# Altium footprint library 7-Connectors-12.PcbLib: 76 footprints (part 5 of 5)
Each footprint in its own frame and in the unit in brackets; x right, y up, seen from the top. Pads: shape width x height; smd on the part's side, far side on the other; paste and mask are expansions set on the pad; w line width, h text height; cw(c..) or ccw(c..) is an arc to the next point about the centre after c.
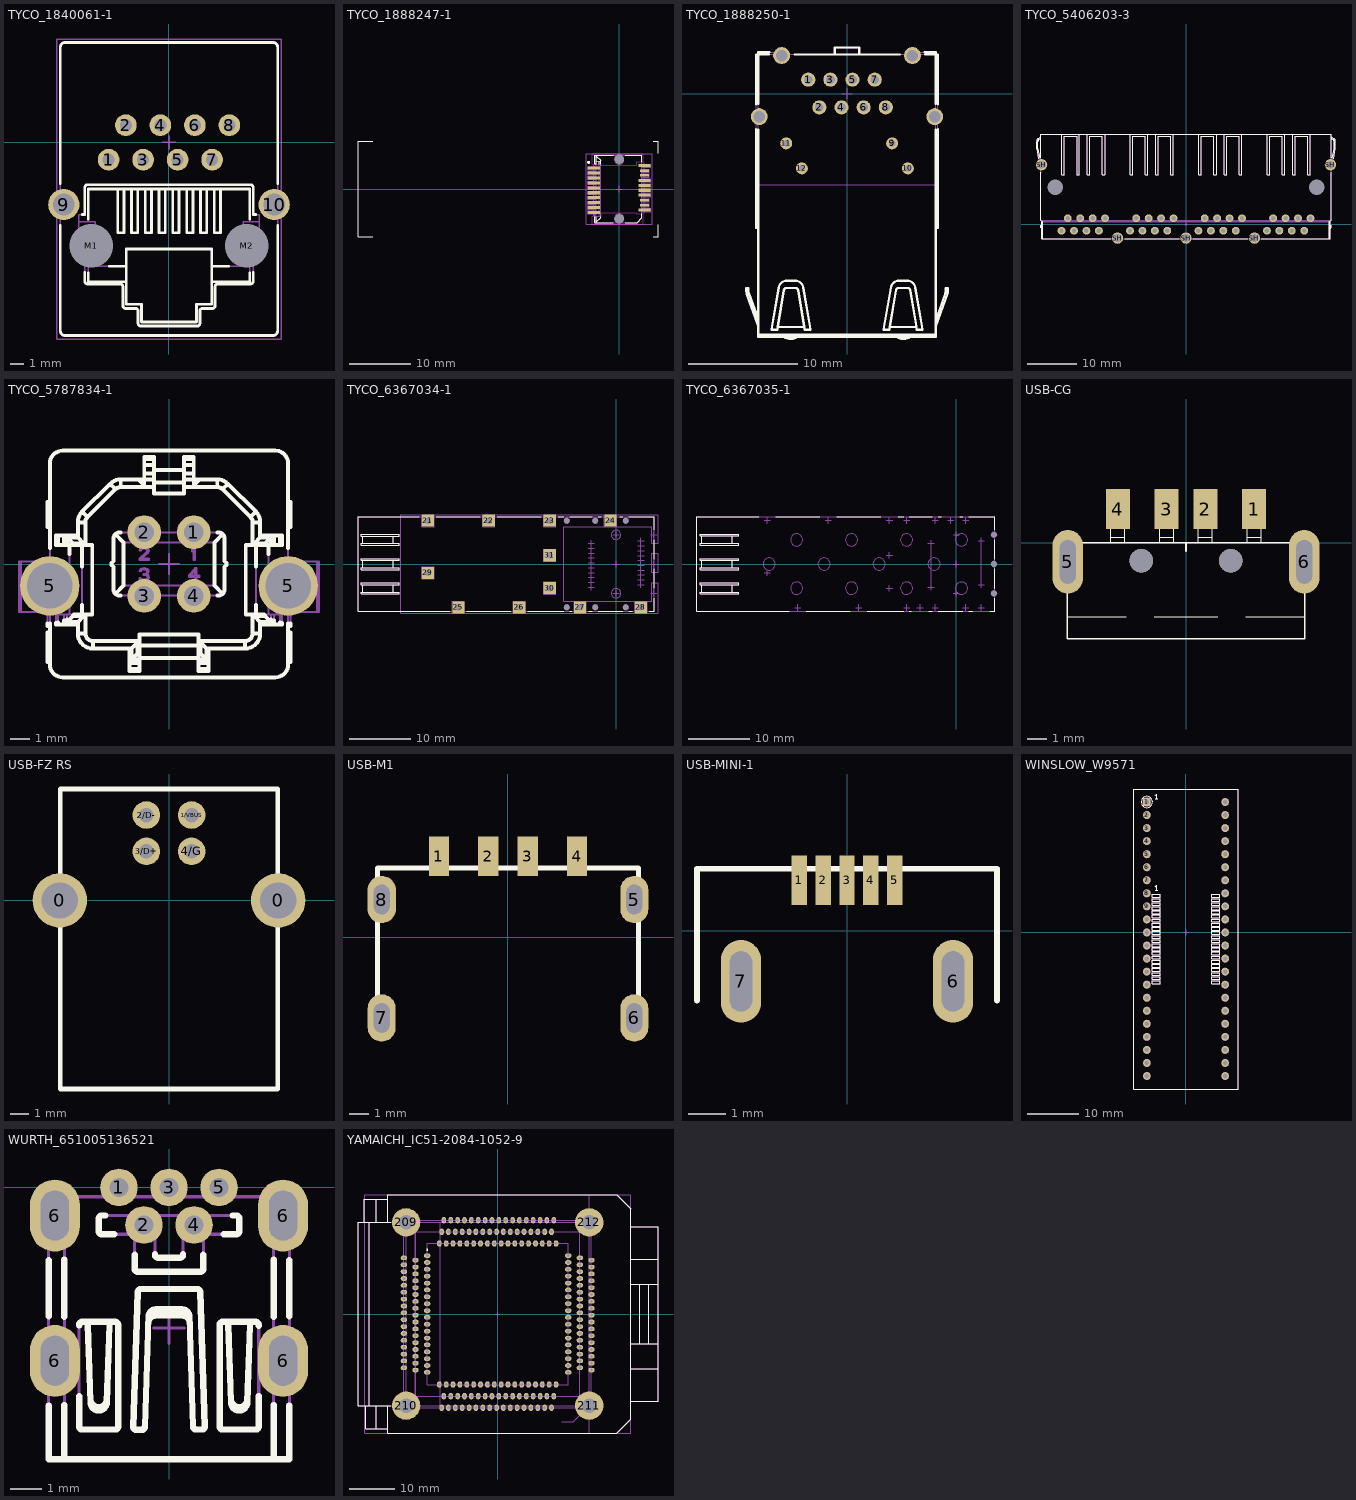
[diagram p4: the footprints below, top view; thin cyan lines are the x and y axes]

## TYCO_1840061-1 [mm] "1 Port, Without LED, RJ45 10/100Base-T Ethernet Vertical Connector Module With Integrated Magnetics"
height 16.51
pads (12):
  round 1.6 hole 0.9: 1(-4.445,-1.27) 2(-3.175,1.27) 3(-1.905,-1.27) 4(-0.635,1.27) 5(0.635,-1.27) 6(1.905,1.27) 7(3.175,-1.27) 8(4.445,1.27)
  round 2.3 hole 1.6: 9(-7.747,-4.572) 10(7.747,-4.572)
  round 1 hole 3.2 unplated mask+1.1: M1(-5.715,-7.62) M2(5.715,-7.62)
Top Overlay:
  lines w0.2: -8,-6.101 -8,-13.87 ccw(c-7.65,-13.87) -7.65,-14.22 7.65,-14.22 ccw(c7.65,-13.87) 8,-13.87 8,-6.101 ; -8,-3.043 -8,7.02 cw(c-7.65,7.02) -7.65,7.37 7.65,7.37 cw(c7.65,7.02) 8,7.02 8,-3.043 ; -6.382,-5.31 -6.2,-5.31 -6.2,-3.31 cw(c-6,-3.31) -6,-3.11 6,-3.11 cw(c6,-3.31) 6.2,-3.31 6.2,-5.31 6.382,-5.31 ; -6.2,-9.562 -6.2,-10.22 ccw(c-6,-10.22) -6,-10.42 -3.595,-10.42 cw(c-3.595,-10.62) -3.395,-10.62 -3.395,-12.02 ccw(c-3.195,-12.02) -3.195,-12.22 -2.475,-12.22 cw(c-2.475,-12.42) -2.275,-12.42 -2.275,-13.32 ccw(c-2.075,-13.32) -2.075,-13.52 2.075,-13.52 ccw(c2.075,-13.32) 2.275,-13.32 2.275,-12.42 cw(c2.475,-12.42) 2.475,-12.22 3.195,-12.22 ccw(c3.195,-12.02) 3.395,-12.02 3.395,-10.62 cw(c3.595,-10.62) 3.595,-10.42 6,-10.42 ccw(c6,-10.22) 6.2,-10.22 6.2,-9.562 ; -5.955,-9.607 -5.955,-10.25 -3.15,-10.25 ; -5.955,-5.636 -5.955,-3.42 5.955,-3.42 5.955,-5.636 ; -4.379,-9.11 -3.15,-9.11 ; -3.78,-3.42 -3.78,-6.654 -3.32,-6.654 -3.32,-3.42 ; -2.764,-3.42 -2.764,-6.654 -2.304,-6.654 -2.304,-3.42 ; -1.748,-3.42 -1.748,-6.654 -1.288,-6.654 -1.288,-3.42 ; -0.732,-3.42 -0.732,-6.654 -0.272,-6.654 -0.272,-3.42 ; 0.284,-3.42 0.284,-6.654 0.744,-6.654 0.744,-3.42 ; 1.3,-3.42 1.3,-6.654 1.76,-6.654 1.76,-3.42 ; 2.316,-3.42 2.316,-6.654 2.776,-6.654 2.776,-3.42 ; 3.15,-10.25 5.955,-10.25 5.955,-9.607 ; 3.15,-9.11 4.379,-9.11 ; 3.332,-3.42 3.332,-6.654 3.792,-6.654 3.792,-3.42 ; -3.15,-11.92 -2.03,-11.92 -2.03,-13.22 2.03,-13.22 2.03,-11.92 3.15,-11.92 3.15,-7.84 -3.15,-7.84 -3.15,-11.92
Mechanical 8:
  lines w0.1: -8.245,-4.572 -7.745,-4.572 ; -7.745,-5.072 -7.745,-4.572 ; -7.745,-4.072 -7.745,-4.572 ; -7.245,-4.572 -7.745,-4.572 ; -6.215,-7.622 -5.715,-7.622 ; -5.715,-8.122 -5.715,-7.622 ; -5.715,-7.122 -5.715,-7.622 ; -5.215,-7.622 -5.715,-7.622 ; -4.945,-1.272 -4.445,-1.272 ; -4.445,-1.772 -4.445,-1.272 ; -4.445,-0.772 -4.445,-1.272 ; -3.945,-1.272 -4.445,-1.272 ; -3.675,1.268 -3.175,1.268 ; -3.175,0.768 -3.175,1.268 ; -3.175,1.768 -3.175,1.268 ; -2.675,1.268 -3.175,1.268 ; -2.405,-1.272 -1.905,-1.272 ; -1.905,-1.772 -1.905,-1.272 ; -1.905,-0.772 -1.905,-1.272 ; -1.405,-1.272 -1.905,-1.272 ; -1.135,1.268 -0.635,1.268 ; -0.635,0.768 -0.635,1.268 ; -0.635,1.768 -0.635,1.268 ; -0.5,0 0,0 ; -0.135,1.268 -0.635,1.268 ; 0,-0.5 0,0 ; 0,0.5 0,0 ; 0.135,-1.272 0.635,-1.272 ; 0.5,0 0,0 ; 0.635,-1.772 0.635,-1.272 ; 0.635,-0.772 0.635,-1.272 ; 1.135,-1.272 0.635,-1.272 ; 1.405,1.268 1.905,1.268 ; 1.905,0.768 1.905,1.268 ; 1.905,1.768 1.905,1.268 ; 2.405,1.268 1.905,1.268 ; 2.675,-1.272 3.175,-1.272 ; 3.175,-1.772 3.175,-1.272 ; 3.175,-0.772 3.175,-1.272 ; 3.675,-1.272 3.175,-1.272 ; 3.945,1.268 4.445,1.268 ; 4.445,0.768 4.445,1.268 ; 4.445,1.768 4.445,1.268 ; 4.945,1.268 4.445,1.268 ; 5.215,-7.622 5.715,-7.622 ; 5.715,-8.122 5.715,-7.622 ; 5.715,-7.122 5.715,-7.622 ; 6.215,-7.622 5.715,-7.622 ; 7.245,-4.572 7.745,-4.572 ; 7.745,-5.072 7.745,-4.572 ; 7.745,-4.072 7.745,-4.572 ; 8.245,-4.572 7.745,-4.572
Mechanical 14:
  lines w0.1: -6.635,-7.85 -5.449,-7.85 -5.449,-5.82 -6.635,-5.82 ; -5.955,-9.11 -3.15,-9.11 ; -5.955,-7.85 -5.955,-10.25 -3.15,-10.25 ; -5.955,-5.82 -5.955,-3.42 5.955,-3.42 5.955,-5.82 ; -3.78,-3.42 -3.78,-6.654 -3.32,-6.654 -3.32,-3.42 ; -2.764,-3.42 -2.764,-6.654 -2.304,-6.654 -2.304,-3.42 ; -1.748,-3.42 -1.748,-6.654 -1.288,-6.654 -1.288,-3.42 ; -0.732,-3.42 -0.732,-6.654 -0.272,-6.654 -0.272,-3.42 ; 0.284,-3.42 0.284,-6.654 0.744,-6.654 0.744,-3.42 ; 1.3,-3.42 1.3,-6.654 1.76,-6.654 1.76,-3.42 ; 2.316,-3.42 2.316,-6.654 2.776,-6.654 2.776,-3.42 ; 3.15,-10.25 5.955,-10.25 5.955,-7.85 ; 3.15,-9.11 5.954,-9.11 ; 3.332,-3.42 3.332,-6.654 3.792,-6.654 3.792,-3.42 ; 6.635,-7.85 5.48,-7.85 5.48,-5.82 6.635,-5.82 ; -8,-13.87 ccw(c-7.65,-13.87) -7.65,-14.22 7.65,-14.22 ccw(c7.65,-13.87) 8,-13.87 8,7.02 ccw(c7.65,7.02) 7.65,7.37 -7.65,7.37 ccw(c-7.65,7.02) -8,7.02 -8,-13.87 ; -6.635,-8.36 -6.635,-5.31 -6.2,-5.31 -6.2,-3.31 cw(c-6,-3.31) -6,-3.11 6,-3.11 cw(c6,-3.31) 6.2,-3.31 6.2,-5.31 6.635,-5.31 6.635,-8.36 6.2,-8.36 6.2,-10.22 cw(c6,-10.22) 6,-10.42 3.595,-10.42 ccw(c3.595,-10.62) 3.395,-10.62 3.395,-12.02 cw(c3.195,-12.02) 3.195,-12.22 2.475,-12.22 ccw(c2.475,-12.42) 2.275,-12.42 2.275,-13.32 cw(c2.075,-13.32) 2.075,-13.52 -2.075,-13.52 cw(c-2.075,-13.32) -2.275,-13.32 -2.275,-12.42 ccw(c-2.475,-12.42) -2.475,-12.22 -3.195,-12.22 cw(c-3.195,-12.02) -3.395,-12.02 -3.395,-10.62 ccw(c-3.595,-10.62) -3.595,-10.42 -6,-10.42 cw(c-6,-10.22) -6.2,-10.22 -6.2,-8.36 -6.635,-8.36 ; -3.15,-11.92 -2.03,-11.92 -2.03,-13.22 2.03,-13.22 2.03,-11.92 3.15,-11.92 3.15,-7.84 -3.15,-7.84 -3.15,-11.92
Mechanical 15:
  lines w0.1: -8.25,-14.47 8.25,-14.47 8.25,7.62 -8.25,7.62 -8.25,-14.47
3D body "TYCO_1840061-1.stp": height 16.51, standoff -4, extent -8,-14.22 8,7.37

## TYCO_1888247-1 [mm] "20 Position, Pitch 0.8mm SFP Receptacle (Small Form-factor Pluggable)"
height 5.4
pads (22):
  rect 2x0.5 smd: 1(-4.1,3.395) 2(-4.1,2.595) 3(-4.1,1.795) 4(-4.1,0.995) 5(-4.1,0.195) 6(-4.1,-0.605) 7(-4.1,-1.405) 8(-4.1,-2.205) 9(-4.1,-3.005) 10(-4.1,-3.805) 11(4.1,-3.405) 14(4.1,-1.005) 15(4.1,-0.205) 16(4.1,0.595) 17(4.1,1.395) 20(4.1,3.795)
  rect 1.5x0.4 smd: 12(4.1,-2.605) 13(4.1,-1.805) 18(4.1,2.195) 19(4.1,2.995)
  round 1 hole 1.55 unplated mask+0.28: MTG1(0,4.795) MTG2(0,-4.805)
Top Layer keep-out:
  lines w0.1: -4.34,-5.755 -4.34,-4.395 -2.88,-4.395 -2.88,-3.855 2.88,-3.855 2.88,-3.995 3.94,-3.995 3.94,-4.805 3.94,-5.755 -4.34,-5.755 ; -4.34,3.985 -4.34,5.745 3.94,5.745 3.94,4.385 2.88,4.385 2.88,3.845 -2.88,3.845 -2.88,3.985 -4.34,3.985
Top Overlay:
  circle w0.25: c-4.955,4.318 r0.125
  lines w0.2: -40,-7.774 -42.4,-7.774 -42.4,7.774 -40,7.774 ; -4,-4.505 -4,-5.505 -0.944,-5.505 ; -3.7,-5.505 -3.7,-4.505 ; -3.7,-5.305 -2.98,-4.705 -2.98,-4.505 ; -3.7,4.045 -3.7,5.495 ; -3.7,4.095 -4,4.095 -4,5.495 -0.944,5.495 ; -3.7,4.432 -2.98,4.495 ; -3.7,5.295 -2.98,4.695 -2.98,4.045 ; -3.223,4.045 -3.223,4.474 ; 0.944,-5.505 2.9,-5.505 3.7,-4.705 3.7,-4.055 ; 0.944,5.495 3.7,5.495 3.7,4.445 ; 5.5,-7.774 6.3,-7.774 6.3,-5.777 ; 5.5,7.774 6.3,7.774 6.3,5.777
Mechanical 8:
  circle w0.1: c0,-4.805 r0.775
  circle w0.1: c0,4.795 r0.775
  lines w0.1: -4.6,-3.805 -4.1,-3.805 -3.6,-3.805 ; -4.6,-3.005 -4.1,-3.005 -3.6,-3.005 ; -4.6,-2.205 -4.1,-2.205 -3.6,-2.205 ; -4.6,-1.405 -4.1,-1.405 -3.6,-1.405 ; -4.6,-0.605 -4.1,-0.605 -3.6,-0.605 ; -4.6,0.195 -4.1,0.195 -3.6,0.195 ; -4.6,0.995 -4.1,0.995 -3.6,0.995 ; -4.6,1.795 -4.1,1.795 -3.6,1.795 ; -4.6,2.595 -4.1,2.595 -3.6,2.595 ; -4.6,3.395 -4.1,3.395 -3.6,3.395 ; -4.1,-4.305 -4.1,3.895 ; -0.5,-4.805 0,-4.805 ; -0.5,0 0,0 ; -0.5,4.795 0,4.795 ; 0,-5.305 0,-4.805 ; 0,-4.305 0,-4.805 ; 0,-0.5 0,0 ; 0,0.5 0,0 ; 0,4.295 0,4.795 ; 0,5.295 0,4.795 ; 0.5,-4.805 0,-4.805 ; 0.5,0 0,0 ; 0.5,4.795 0,4.795 ; 3.6,-3.405 4.1,-3.405 4.6,-3.405 ; 3.6,-2.605 4.1,-2.605 4.6,-2.605 ; 3.6,-1.805 4.1,-1.805 4.6,-1.805 ; 3.6,-1.005 4.1,-1.005 4.6,-1.005 ; 3.6,-0.205 4.1,-0.205 4.6,-0.205 ; 3.6,0.595 4.1,0.595 4.6,0.595 ; 3.6,1.395 4.1,1.395 4.6,1.395 ; 3.6,2.195 4.1,2.195 4.6,2.195 ; 3.6,2.995 4.1,2.995 4.6,2.995 ; 3.6,3.795 4.1,3.795 4.6,3.795 ; 4.1,-3.905 4.1,4.295
Mechanical 14:
  circle w0.1: c-4.955,4.318 r0.125
  lines w0.1: -3.7,-5.505 -3.7,-4.105 ; -3.7,-5.305 -2.98,-4.705 -2.98,-4.505 ; -3.7,-4.442 -2.98,-4.505 ; -3.7,-4.055 -5.1,-4.055 -5.1,-3.555 -3.7,-3.555 ; -3.7,-3.255 -5.1,-3.255 -5.1,-2.755 -3.7,-2.755 ; -3.7,-2.455 -5.1,-2.455 -5.1,-1.955 -3.7,-1.955 ; -3.7,-1.655 -5.1,-1.655 -5.1,-1.155 -3.7,-1.155 ; -3.7,-0.855 -5.1,-0.855 -5.1,-0.355 -3.7,-0.355 ; -3.7,-0.055 -5.1,-0.055 -5.1,0.445 -3.7,0.445 ; -3.7,0.745 -5.1,0.745 -5.1,1.245 -3.7,1.245 ; -3.7,1.545 -5.1,1.545 -5.1,2.045 -3.7,2.045 ; -3.7,2.345 -5.1,2.345 -5.1,2.845 -3.7,2.845 ; -3.7,3.145 -5.1,3.145 -5.1,3.645 -3.7,3.645 ; -3.7,4.432 -2.98,4.495 ; -3.7,5.295 -2.985,4.695 -2.98,4.695 -2.98,4.495 ; -3.7,5.495 -3.7,4.095 ; -3.223,-4.484 -3.223,4.474 ; 3.7,-3.655 5.1,-3.655 5.1,-3.155 3.7,-3.155 ; 3.7,-2.855 4.85,-2.855 4.85,-2.355 3.7,-2.355 ; 3.7,-2.055 4.85,-2.055 4.85,-1.555 3.7,-1.555 ; 3.7,-1.255 5.1,-1.255 5.1,-0.755 3.7,-0.755 ; 3.7,-0.455 5.1,-0.455 5.1,0.045 3.7,0.045 ; 3.7,0.345 5.1,0.345 5.1,0.845 3.7,0.845 ; 3.7,1.145 5.1,1.145 5.1,1.645 3.7,1.645 ; 3.7,1.945 4.85,1.945 4.85,2.445 3.7,2.445 ; 3.7,2.745 4.85,2.745 4.85,3.245 3.7,3.245 ; 3.7,3.545 5.1,3.545 5.1,4.045 3.7,4.045 ; -3.7,-4.105 -4,-4.105 -4,-5.505 2.9,-5.505 3.7,-4.705 3.7,5.495 -4,5.495 -4,4.095 -3.7,4.095 ; -3.7,-4.105 -3.7,4.095 ; -2.98,-4.505 -2.98,4.495
Mechanical 15:
  lines w0.1: -5.325,-5.755 -5.325,5.745 5.375,5.745 5.375,-5.755 -5.325,-5.755
3D body "TYCO_1888247-1.stp": height 5.22, standoff -0.8, extent -4.5,-5.505 4.5,5.495

## TYCO_1888250-1 [mm] "1 Port, Yellow/Green LEDs, RJ45 10/100Base-T, Cat 5, Ethernet Connector Module"
height 7.38
pads (16):
  round 1.3 hole 0.8: 1(-3.556,1.27) 2(-2.54,-1.27) 3(-1.524,1.27) 4(-0.508,-1.27) 5(0.508,1.27) 6(1.524,-1.27) 7(2.54,1.27) 8(3.556,-1.27)
  round 1.1 hole 0.6: 9(4.14,-4.57) 10(5.58,-6.87) 11(-5.58,-4.57) 12(-4.14,-6.87)
  round 1.55 hole 1.05: SHIELD(-8.045,-2.12) SHIELD(-6,3.48) SHIELD(6,3.48) SHIELD(8.045,-2.12)
Top Overlay:
  lines w0.2: -8.345,-3.256 -8.345,-12.32 -8.145,-12.32 ; -8.345,-0.984 -8.345,3.58 -7.171,3.58 ; -8.145,-22.12 8.145,-22.12 ; -8.145,-20.703 -9.015,-18.311 cw(c-8.545,-18.14) -9.045,-18.14 -9.045,-17.84 -9.245,-17.84 -9.245,-18.14 ccw(c-8.545,-18.14) -9.203,-18.379 -8.19,-21.164 ; -8.145,-3.291 -8.145,-22.32 8.145,-22.32 8.145,-3.291 ; -8.145,-0.949 -8.145,3.78 -7.136,3.78 ; -5.841,-22.326 ccw(c-5.029,-20.72) -5.16,-22.515 ccw(c-5.291,-20.72) -4.47,-22.322 ; -4.829,3.58 4.829,3.58 ; -4.482,-18.052 ccw(c-4.729,-18.09) -4.729,-17.84 -5.551,-17.84 ccw(c-5.551,-18.09) -5.798,-18.052 -6.359,-21.42 ; -4.475,-18.051 -3.921,-21.42 ; -1.119,3.58 -1.119,4.22 1.125,4.22 1.125,3.58 ; 4.471,-22.322 ccw(c5.291,-20.72) 5.16,-22.515 ccw(c5.029,-20.72) 5.843,-22.325 ; 5.798,-18.052 ccw(c5.551,-18.09) 5.551,-17.84 4.729,-17.84 ccw(c4.729,-18.09) 4.482,-18.052 3.921,-21.42 ; 5.805,-18.051 6.359,-21.42 ; 7.136,3.78 8.145,3.78 8.145,-0.949 ; 7.171,3.58 8.345,3.58 8.345,-0.984 ; 8.145,-21.42 8.165,-21.303 9.205,-18.374 ccw(c8.545,-18.14) 9.245,-18.14 ; 8.145,-20.762 9.016,-18.307 ccw(c8.545,-18.14) 9.045,-18.14 9.045,-17.84 9.245,-17.84 9.245,-18.143 ; 8.145,-12.32 8.345,-12.32 8.345,-3.256 ; -8.19,-21.164 -8.145,-21.42 -8.19,-21.164 ; -6.359,-21.42 -6.39,-21.67 -6.938,-21.67 -6.257,-17.79 cw(c-5.519,-17.92) -5.519,-17.17 -4.761,-17.17 cw(c-4.761,-17.92) -4.023,-17.79 -3.342,-21.67 -3.89,-21.67 -3.921,-21.42 ; -6.359,-21.42 -3.921,-21.42 ; 3.921,-21.42 3.89,-21.67 3.342,-21.67 4.023,-17.79 cw(c4.761,-17.92) 4.761,-17.17 5.519,-17.17 cw(c5.519,-17.92) 6.257,-17.79 6.938,-21.67 6.39,-21.67 6.359,-21.42 ; 3.921,-21.42 6.359,-21.42
Mechanical 8:
  lines w0.1: -8.545,-2.12 -8.045,-2.12 ; -8.15,-8.37 8.15,-8.37 ; -8.045,-2.62 -8.045,-2.12 ; -8.045,-1.62 -8.045,-2.12 ; -7.545,-2.12 -8.045,-2.12 ; -6.5,3.48 -6,3.48 ; -6.08,-4.57 -5.58,-4.57 ; -6,2.98 -6,3.48 ; -6,3.98 -6,3.48 ; -5.58,-5.07 -5.58,-4.57 ; -5.58,-4.07 -5.58,-4.57 ; -5.5,3.48 -6,3.48 ; -5.08,-4.57 -5.58,-4.57 ; -4.64,-6.87 -4.14,-6.87 ; -4.14,-7.37 -4.14,-6.87 ; -4.14,-6.37 -4.14,-6.87 ; -4.056,1.27 -3.556,1.27 ; -3.64,-6.87 -4.14,-6.87 ; -3.556,0.77 -3.556,1.27 ; -3.556,1.77 -3.556,1.27 ; -3.056,1.27 -3.556,1.27 ; -3.04,-1.27 -2.54,-1.27 ; -2.54,-1.77 -2.54,-1.27 ; -2.54,-0.77 -2.54,-1.27 ; -2.04,-1.27 -2.54,-1.27 ; -2.024,1.27 -1.524,1.27 ; -1.524,0.77 -1.524,1.27 ; -1.524,1.77 -1.524,1.27 ; -1.024,1.27 -1.524,1.27 ; -1.008,-1.27 -0.508,-1.27 ; -0.508,-1.77 -0.508,-1.27 ; -0.508,-0.77 -0.508,-1.27 ; -0.5,0 0,0 ; -0.008,-1.27 -0.508,-1.27 ; 0,-0.5 0,0 ; 0,0.5 0,0 ; 0.008,1.27 0.508,1.27 ; 0.5,0 0,0 ; 0.508,0.77 0.508,1.27 ; 0.508,1.77 0.508,1.27 ; 1.008,1.27 0.508,1.27 ; 1.024,-1.27 1.524,-1.27 ; 1.524,-1.77 1.524,-1.27 ; 1.524,-0.77 1.524,-1.27 ; 2.024,-1.27 1.524,-1.27 ; 2.04,1.27 2.54,1.27 ; 2.54,0.77 2.54,1.27 ; 2.54,1.77 2.54,1.27 ; 3.04,1.27 2.54,1.27 ; 3.056,-1.27 3.556,-1.27 ; 3.556,-1.77 3.556,-1.27 ; 3.556,-0.77 3.556,-1.27 ; 3.64,-4.57 4.14,-4.57 ; 4.056,-1.27 3.556,-1.27 ; 4.14,-5.07 4.14,-4.57 ; 4.14,-4.07 4.14,-4.57 ; 4.64,-4.57 4.14,-4.57 ; 5.08,-6.87 5.58,-6.87 ; 5.5,3.48 6,3.48 ; 5.58,-7.37 5.58,-6.87 ; 5.58,-6.37 5.58,-6.87 ; 6,2.98 6,3.48 ; 6,3.98 6,3.48 ; 6.08,-6.87 5.58,-6.87 ; 6.5,3.48 6,3.48 ; 7.545,-2.12 8.045,-2.12 ; 8.045,-2.62 8.045,-2.12 ; 8.045,-1.62 8.045,-2.12 ; 8.545,-2.12 8.045,-2.12
Mechanical 14:
  lines w0.1: -8.145,-22.12 8.145,-22.12 ; -8.145,-20.703 -9.015,-18.311 cw(c-8.545,-18.14) -9.045,-18.14 -9.045,-17.84 -9.245,-17.84 -9.245,-18.14 ccw(c-8.545,-18.14) -9.203,-18.379 -8.19,-21.164 ; -8.145,-12.32 -8.345,-12.32 -8.345,3.58 8.345,3.58 8.345,-12.32 8.145,-12.32 ; -6.395,3.58 -6.395,3.78 -8.145,3.78 -8.145,-22.32 8.145,-22.32 8.145,3.78 6.395,3.78 6.395,3.58 ; -5.841,-22.326 ccw(c-5.029,-20.72) -5.16,-22.515 ccw(c-5.291,-20.72) -4.47,-22.322 ; -4.482,-18.052 ccw(c-4.729,-18.09) -4.729,-17.84 -5.551,-17.84 ccw(c-5.551,-18.09) -5.798,-18.052 -6.359,-21.42 ; -4.475,-18.051 -3.921,-21.42 ; -1.119,3.58 -1.119,4.22 1.125,4.22 1.125,3.58 ; 4.473,-22.323 ccw(c5.291,-20.72) 5.16,-22.515 ccw(c5.029,-20.72) 5.851,-22.321 ; 5.798,-18.052 ccw(c5.551,-18.09) 5.551,-17.84 4.729,-17.84 ccw(c4.729,-18.09) 4.482,-18.052 3.921,-21.42 ; 5.805,-18.051 6.359,-21.42 ; 8.145,-21.42 8.165,-21.303 9.205,-18.374 ccw(c8.545,-18.14) 9.245,-18.14 ; 8.145,-20.762 9.016,-18.307 ccw(c8.545,-18.14) 9.045,-18.14 9.045,-17.84 9.245,-17.84 9.245,-18.143 ; -8.19,-21.164 -8.145,-21.42 -8.19,-21.164 ; -6.359,-21.42 -6.39,-21.67 -6.938,-21.67 -6.257,-17.79 cw(c-5.519,-17.92) -5.519,-17.17 -4.761,-17.17 cw(c-4.761,-17.92) -4.023,-17.79 -3.342,-21.67 -3.89,-21.67 -3.921,-21.42 ; -6.359,-21.42 -3.921,-21.42 ; 3.921,-21.42 3.89,-21.67 3.342,-21.67 4.023,-17.79 cw(c4.761,-17.92) 4.761,-17.17 5.519,-17.17 cw(c5.519,-17.92) 6.257,-17.79 6.938,-21.67 6.39,-21.67 6.359,-21.42 ; 3.921,-21.42 6.359,-21.42
Drill Drawing:
  lines w0.1: -9.25,-8.355 -9.25,5 9.245,5 9.245,-8.355 -7.08,-8.355 -9.25,-8.355
  text "+0.05/-0.05" at -4.5,-13 h1
  text "Daimeter Tolerance" at -6.5,-11.5 h1
  text "PRESS-FIT TECHNOLOGY" at -8.5,-10 h1
3D body "TYCO_1888250-1.stp": height 8.48, standoff -5.3, extent -9.245,-22.515 9.245,4.22

## TYCO_5406203-3 [mm] "4 x RJ45 Jacks - 8 Positions"
height 13.64
pads (39):
  round 1.6 hole 0.9: 1A(-16.51,1.27) 1B(-2.54,1.27) 1C(11.43,1.27) 1D(25.4,1.27) 2A(-17.78,-1.27) 2B(-3.81,-1.27) 2C(10.16,-1.27) 2D(24.13,-1.27) 3A(-19.05,1.27) 3B(-5.08,1.27) 3C(8.89,1.27) 3D(22.86,1.27) 4A(-20.32,-1.27) 4B(-6.35,-1.27) 4C(7.62,-1.27) 4D(21.59,-1.27) 5A(-21.59,1.27) 5B(-7.62,1.27) 5C(6.35,1.27) 5D(20.32,1.27) 6A(-22.86,-1.27) 6B(-8.89,-1.27) 6C(5.08,-1.27) 6D(19.05,-1.27) 7A(-24.13,1.27) 7B(-10.16,1.27) 7C(3.81,1.27) 7D(17.78,1.27) 8A(-25.4,-1.27) 8B(-11.43,-1.27) 8C(2.54,-1.27) 8D(16.51,-1.27)
  round 1 hole 3.2 unplated mask+1.35: M1(26.67,7.62) M2(-26.67,7.62)
  round 2.3 hole 1.6: SH(-29.46,12.19) SH(-13.97,-2.792) SH(0,-2.792) SH(13.97,-2.792) SH(29.46,12.19)
Top Overlay:
  lines w0.2: -30.12,13.402 -30.505,15.499 -30.505,16.896 cw(c-29.845,16.946) -30.183,17.516 -29.591,17.93 ; -29.894,13.548 -30.256,15.499 -30.256,16.896 cw(c-29.757,16.9) -30.04,17.312 -29.591,17.626 ; -29.591,10.7 -29.591,0.894 -29.274,0.645 -29.274,0.513 -29.459,0.513 -29.459,-2.916 -15.4,-2.916 ; -29.591,13.616 -29.591,18.42 29.591,18.42 29.591,13.616 ; -29.459,-1.039 -29.68,-0.625 -29.68,-0.117 -29.459,-0.117 ; -29.21,-2.916 -29.21,0.513 ; -25.349,18.42 -25.349,10.165 -24.841,10.165 -24.841,18.014 -22.301,18.014 -22.301,10.165 -21.793,10.165 -21.793,18.42 ; -20.142,18.42 -20.142,10.165 -19.634,10.165 -19.634,18.014 -17.094,18.014 -17.094,10.165 -16.586,10.165 -16.586,18.42 ; -12.5,-2.916 -1.4,-2.916 ; -11.379,18.42 -11.379,10.165 -10.871,10.165 -10.871,18.014 -8.331,18.014 -8.331,10.165 -7.823,10.165 -7.823,18.42 ; -6.172,18.42 -6.172,10.165 -5.664,10.165 -5.664,18.014 -3.124,18.014 -3.124,10.165 -2.616,10.165 -2.616,18.42 ; 1.4,-2.916 12.6,-2.916 ; 2.592,18.42 2.592,10.165 3.1,10.165 3.1,18.014 5.64,18.014 5.64,10.165 6.148,10.165 6.148,18.42 ; 7.799,18.42 7.799,10.165 8.307,10.165 8.307,18.014 10.847,18.014 10.847,10.165 11.355,10.165 11.355,18.42 ; 15.4,-2.916 29.459,-2.916 29.459,0.513 29.274,0.513 29.274,0.645 29.591,0.894 29.591,10.7 ; 16.562,18.42 16.562,10.165 17.07,10.165 17.07,18.014 19.61,18.014 19.61,10.165 20.118,10.165 20.118,18.42 ; 21.769,18.42 21.769,10.165 22.277,10.165 22.277,18.014 24.817,18.014 24.817,10.165 25.325,10.165 25.325,18.42 ; 29.21,-2.916 29.21,0.513 ; 29.459,-1.039 29.68,-0.625 29.68,-0.117 29.459,-0.117 ; 29.591,17.626 30.04,17.312 cw(c29.757,16.9) 30.256,16.896 30.256,15.499 29.894,13.548 ; 29.591,17.93 30.183,17.516 cw(c29.845,16.946) 30.505,16.896 30.505,15.499 30.12,13.402
Mechanical 8:
  drawing of 156 lines, arcs and shapes, not listed
Mechanical 14:
  lines w0.1: -29.591,10.526 -30.505,15.499 -30.505,16.896 cw(c-29.845,16.946) -30.183,17.516 -29.591,17.93 ; -29.591,11.914 -30.256,15.499 -30.256,16.896 cw(c-29.757,16.9) -30.04,17.312 -29.591,17.626 ; -29.459,-1.039 -29.68,-0.625 -29.68,-0.117 -29.459,-0.117 ; -29.21,-2.916 -29.21,0.513 29.21,0.513 29.21,-2.916 ; -25.349,18.42 -25.349,10.165 -24.841,10.165 -24.841,18.014 -22.301,18.014 -22.301,10.165 -21.793,10.165 -21.793,18.42 ; -20.142,18.42 -20.142,10.165 -19.634,10.165 -19.634,18.014 -17.094,18.014 -17.094,10.165 -16.586,10.165 -16.586,18.42 ; -11.379,18.42 -11.379,10.165 -10.871,10.165 -10.871,18.014 -8.331,18.014 -8.331,10.165 -7.823,10.165 -7.823,18.42 ; -6.172,18.42 -6.172,10.165 -5.664,10.165 -5.664,18.014 -3.124,18.014 -3.124,10.165 -2.616,10.165 -2.616,18.42 ; 2.592,18.42 2.592,10.165 3.1,10.165 3.1,18.014 5.64,18.014 5.64,10.165 6.148,10.165 6.148,18.42 ; 7.799,18.42 7.799,10.165 8.307,10.165 8.307,18.014 10.847,18.014 10.847,10.165 11.355,10.165 11.355,18.42 ; 16.562,18.42 16.562,10.165 17.07,10.165 17.07,18.014 19.61,18.014 19.61,10.165 20.118,10.165 20.118,18.42 ; 21.769,18.42 21.769,10.165 22.277,10.165 22.277,18.014 24.817,18.014 24.817,10.165 25.325,10.165 25.325,18.42 ; 29.459,-1.039 29.68,-0.625 29.68,-0.117 29.459,-0.117 ; 29.591,10.526 30.505,15.499 30.505,16.896 ccw(c29.845,16.946) 30.183,17.516 29.591,17.93 ; 29.591,11.914 30.256,15.499 30.256,16.896 ccw(c29.757,16.9) 30.04,17.312 29.591,17.626 ; -29.591,0.894 29.591,0.894 ; -29.591,0.894 -29.591,18.42 29.591,18.42 29.591,0.894 ; -29.591,0.894 -29.274,0.645 ; -29.274,0.645 29.274,0.645 ; -29.274,0.645 -29.274,0.513 -29.459,0.513 -29.459,-2.916 29.459,-2.916 29.459,0.513 29.274,0.513 29.274,0.645 ; 29.274,0.645 29.591,0.894